# Altium footprint library ICs.PcbLib: 163 footprints (part 2 of 11)
Each footprint in its own frame and in the unit in brackets; x right, y up, seen from the top. Pads: shape width x height; smd on the part's side, far side on the other; paste and mask are expansions set on the pad; w line width, h text height; cw(c..) or ccw(c..) is an arc to the next point about the centre after c.
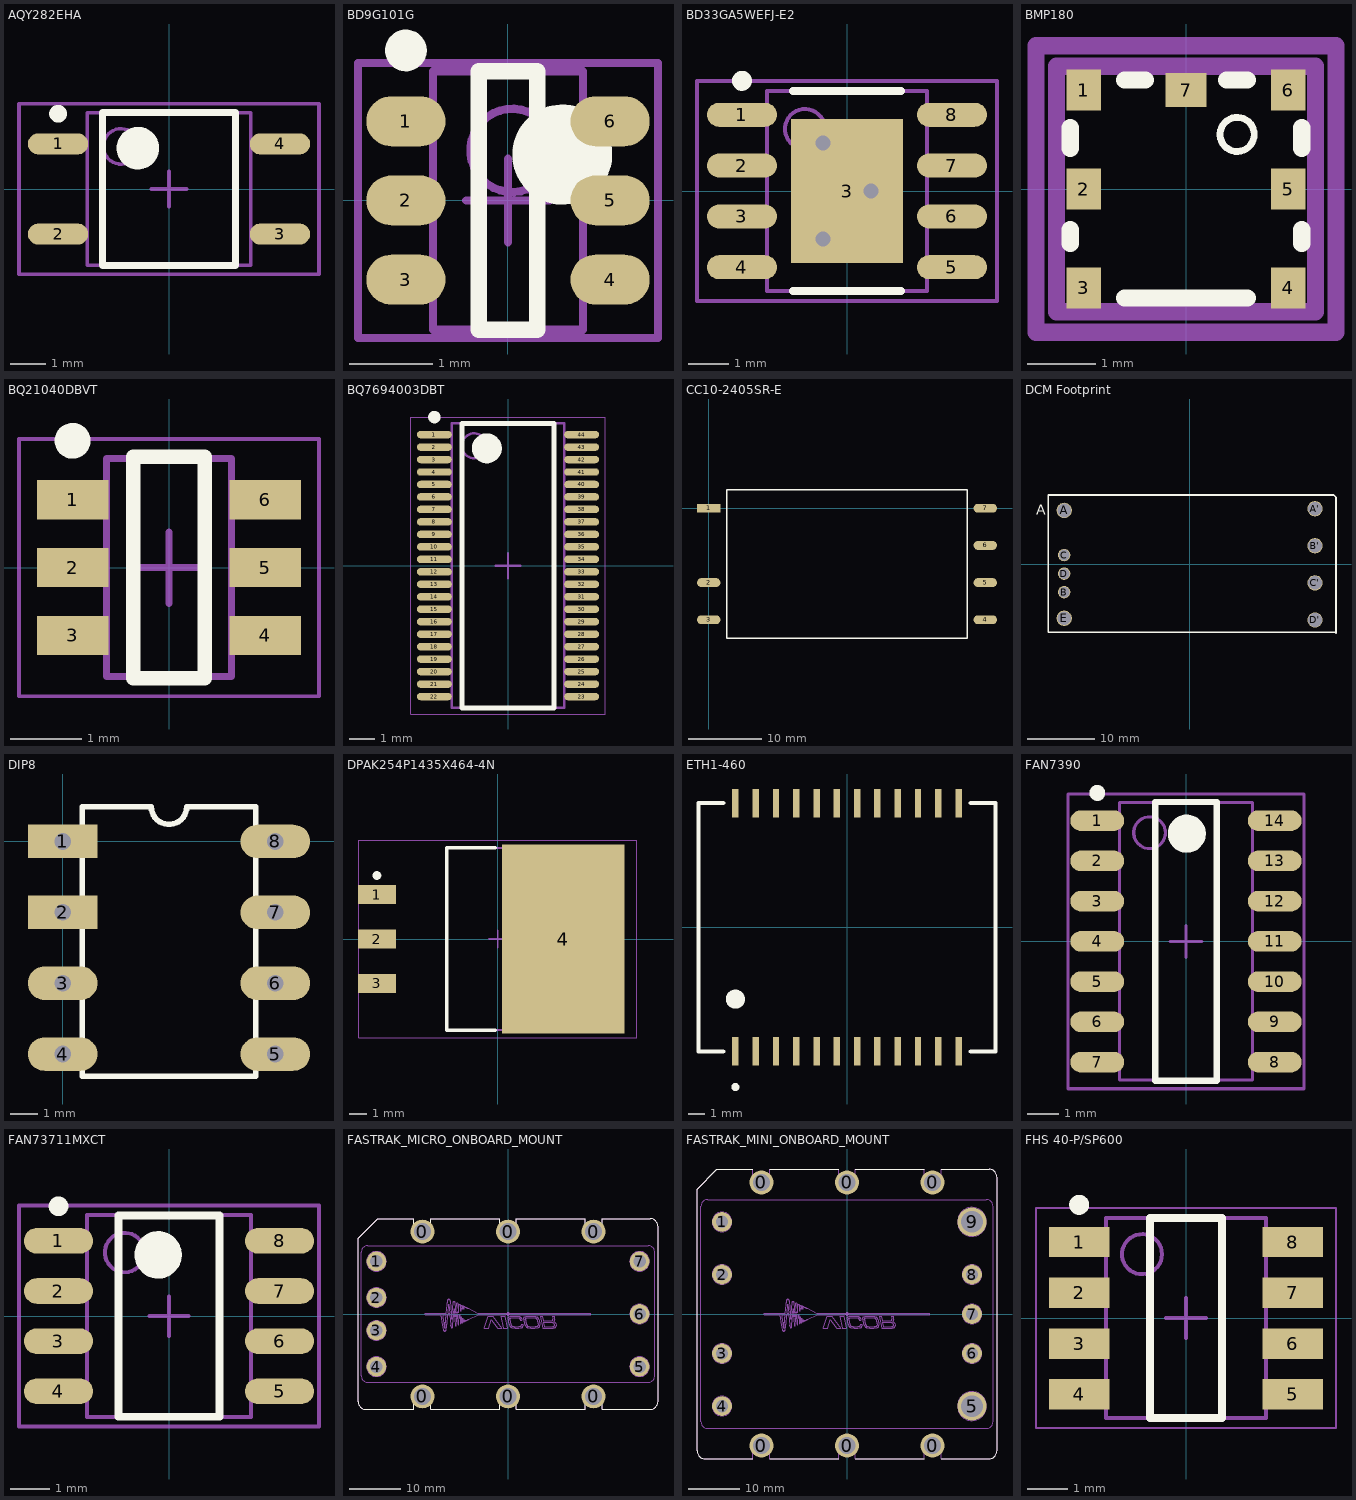
[diagram p1: the footprints below, top view; thin cyan lines are the x and y axes]

## AQY282EHA [mm] "SOP, 4-Leads, Body 4.3x4.6mm (max), Pitch 2.54mm, IPC Medium Density"
height 2.2
pads (4):
  oval 1.7x0.6 smd: 1(-3.125,1.27) 2(-3.125,-1.27) 3(3.125,-1.27) 4(3.125,1.27)
Top Overlay:
  circle w0.6: c-0.875,1.15 r0.3
  circle w0.25: c-3.125,2.12 r0.125
  lines w0.2: -1.875,-2.15 1.875,-2.15 1.875,2.15 -1.875,2.15 -1.875,-2.15
Mechanical 13:
  circle w0.1: c-1.35,1.2 r0.5
  lines w0.1: -2.3,-2.15 2.3,-2.15 2.3,2.15 -2.3,2.15 -2.3,-2.15
Mechanical 15:
  lines w0.1: -0.5,0 0.5,0 ; 0,-0.5 0,0.5 ; -4.225,-2.4 4.225,-2.4 4.225,2.4 -4.225,2.4 -4.225,-2.4
3D body: height 2.2, standoff 0.1, extent -2.3,-2.15 2.3,2.15

## BD9G101G [mm] "Simple Step-down Switching Regulators with Built-in Power MOSFET"
height 1.25
pads (6):
  oval 0.95x0.6 smd: 1(-1.225,0.95) 2(-1.225,0) 3(-1.225,-0.95) 4(1.225,-0.95) 5(1.225,0) 6(1.225,0.95)
Top Overlay:
  circle w0.6: c0.65,0.55 r0.3
  circle w0.25: c-1.225,1.8 r0.125
  lines w0.2: -0.35,-1.55 0.35,-1.55 0.35,1.55 -0.35,1.55 -0.35,-1.55
Mechanical 13:
  circle w0.1: c0.05,0.6 r0.5
  lines w0.1: -0.9,-1.55 0.9,-1.55 0.9,1.55 -0.9,1.55 -0.9,-1.55
Mechanical 15:
  lines w0.1: -0.5,0 0.5,0 ; 0,-0.5 0,0.5 ; -1.8,-1.65 1.8,-1.65 1.8,1.65 -1.8,1.65 -1.8,-1.65
3D body: height 1.25, standoff 0, extent -0.9,-1.55 0.9,1.55

## BD33GA5WEFJ-E2 [mm] "IC REG LDO 3.3V 0.5A 8HTSOP-J"
height 1
pads (9):
  oval 1.75x0.6 smd: 1(-2.625,1.905) 2(-2.625,0.635) 3(-2.625,-0.635) 4(-2.625,-1.905) 5(2.625,-1.905) 6(2.625,-0.635) 7(2.625,0.635) 8(2.625,1.905)
  rect 2.8x3.6 smd: 3(0,0)
via -0.6,1.2 diameter 0.737 hole 0.381
via 0.6,0 diameter 0.737 hole 0.381
via -0.6,-1.2 diameter 0.737 hole 0.381
Top Overlay:
  circle w0.25: c-2.625,2.755 r0.125
  lines w0.2: -1.35,-2.5 1.35,-2.5 ; -1.35,2.5 1.35,2.5
Mechanical 13:
  circle w0.1: c-1.05,1.55 r0.5
  lines w0.1: -2,-2.5 -2,2.5 2,2.5 2,-2.5 -2,-2.5
Mechanical 15:
  lines w0.1: -0.5,0 0.5,0 ; 0,-0.5 0,0.5 ; -3.75,-2.75 -3.75,2.75 3.75,2.75 3.75,-2.75 -3.75,-2.75
3D body: height 1, standoff 0.08, extent -2,-2.5 2,2.5

## BMP180 [mm]
pads (7):
  rect 0.5x0.6 smd: 1(-1.5,1.45) 2(-1.5,0) 3(-1.5,-1.45) 4(1.5,-1.45) 5(1.5,0) 6(1.5,1.45)
  rect 0.6x0.5 smd: 7(0,1.45)
Top Overlay:
  circle w0.1: c0.75,0.8 r0.25
  lines w0.254: -1.7,-0.8 -1.7,-0.6 ; -1.7,0.6 -1.7,0.9 ; -0.9,-1.6 0.9,-1.6 ; -0.9,1.6 -0.6,1.6 ; 0.6,1.6 0.9,1.6 ; 1.7,-0.8 1.7,-0.6 ; 1.7,0.6 1.7,0.9
Mechanical 13:
  lines w0.254: -1.9,-1.8 -1.9,1.8 1.9,1.8 1.9,-1.8 -1.9,-1.8
Mechanical 15:
  lines w0.254: -2.2,-2.1 -2.2,2.1 2.2,2.1 2.2,-2.1 -2.2,-2.1
3D body: height 2, standoff 0, extent -1.9,-1.8 1.9,1.8

## BQ21040DBVT [mm] "IC BAT CHG LI-ION 1 CELL SOT23-6"
height 1.45
pads (6):
  rect 1x0.55 smd: 1(-1.35,0.95) 2(-1.35,0) 3(-1.35,-0.95) 4(1.35,-0.95) 5(1.35,0) 6(1.35,0.95)
Top Overlay:
  circle w0.25: c-1.35,1.775 r0.125
  lines w0.2: -0.5,-1.55 0.5,-1.55 0.5,1.55 -0.5,1.55 -0.5,-1.55
Mechanical 13:
  lines w0.1: -0.875,-1.525 -0.875,1.525 0.875,1.525 0.875,-1.525 -0.875,-1.525
Mechanical 15:
  lines w0.05: -2.1,-1.8 -2.1,1.8 2.1,1.8 2.1,-1.8 -2.1,-1.8
  lines w0.1: -0.5,0 0.5,0 ; 0,-0.5 0,0.5
3D body: height 1.45, standoff 0, extent -0.875,-1.525 0.875,1.525

## BQ7694003DBT [mm] "TSSOP, 44-Leads, Body 11.15x4.40mm, Pitch 0.50mm, IPC Medium Density"
height 1.2
pads (44):
  oval 1.4x0.3 smd: 1(-2.95,5.25) 2(-2.95,4.75) 3(-2.95,4.25) 4(-2.95,3.75) 5(-2.95,3.25) 6(-2.95,2.75) 7(-2.95,2.25) 8(-2.95,1.75) 9(-2.95,1.25) 10(-2.95,0.75) 11(-2.95,0.25) 12(-2.95,-0.25) 13(-2.95,-0.75) 14(-2.95,-1.25) 15(-2.95,-1.75) 16(-2.95,-2.25) 17(-2.95,-2.75) 18(-2.95,-3.25) 19(-2.95,-3.75) 20(-2.95,-4.25) 21(-2.95,-4.75) 22(-2.95,-5.25) 23(2.95,-5.25) 24(2.95,-4.75) 25(2.95,-4.25) 26(2.95,-3.75) 27(2.95,-3.25) 28(2.95,-2.75) 29(2.95,-2.25) 30(2.95,-1.75) 31(2.95,-1.25) 32(2.95,-0.75) 33(2.95,-0.25) 34(2.95,0.25) 35(2.95,0.75) 36(2.95,1.25) 37(2.95,1.75) 38(2.95,2.25) 39(2.95,2.75) 40(2.95,3.25) 41(2.95,3.75) 42(2.95,4.25) 43(2.95,4.75) 44(2.95,5.25)
Top Overlay:
  circle w0.6: c-0.85,4.7 r0.3
  circle w0.25: c-2.95,5.95 r0.125
  lines w0.2: -1.85,-5.7 1.85,-5.7 1.85,5.7 -1.85,5.7 -1.85,-5.7
Mechanical 13:
  circle w0.1: c-1.35,4.8 r0.5
  lines w0.1: -2.25,-5.7 2.25,-5.7 2.25,5.7 -2.25,5.7 -2.25,-5.7
Mechanical 15:
  lines w0.05: -3.9,-5.95 3.9,-5.95 3.9,5.95 -3.9,5.95 -3.9,-5.95
  lines w0.1: -0.5,0 0.5,0 ; 0,-0.5 0,0.5
3D body: height 1.2, standoff 0.05, extent -2.25,-5.7 2.25,5.7

## CC10-2405SR-E [mm] "CONV DC/DC 10W SNGL 24V 5V SMD"
pads (7):
  rect 3.2x1.2 smd: 1(0,0)
  oval 3.2x1.2 smd: 2(0,-10.16) 3(0,-15.24) 4(37.8,-15.24) 5(37.8,-10.16) 6(37.8,-5.08) 7(37.8,0)
Top Overlay:
  lines w0.2: 2.435,-17.78 35.365,-17.78 35.365,2.54 2.435,2.54 2.435,-17.78
3D body "cc10r.stp": height 6.9, standoff -1.6, extent -0.583,-18.869 38.277,3.731

## DCM Footprint [mm] "For DC-DC Converter Module"
pads (9):
  round 2.28 hole 2.03: A(-18.6,8) A'(18.6,8.25) B'(18.6,2.75) C'(18.6,-2.75) D'(18.6,-8.25) E(-18.6,-8)
  round 1.85 hole 1.6: B(-18.6,-4.13) C(-18.6,1.38) D(-18.6,-1.38)
Top Overlay:
  lines w0.254: -20.955,10.262 -20.955,-10.058 21.59,-10.058 21.717,-10.185 21.717,9.957 21.387,10.287 -20.955,10.287
  text "A" at -22.784,7.341 h1.52
3D body "3623_dcm_thruhole.STEP": height 7.49, standoff -3.94, extent -19.358,-11.446 19.358,11.354

## DIP8 [mm]
pads (8):
  rect 2.5x1.2 hole 0.6: 1(0,0) 2(0,-2.54)
  oval 2.5x1.2 hole 0.6: 3(0,-5.08) 4(0,-7.62) 5(7.62,-7.62) 6(7.62,-5.08) 7(7.62,-2.54) 8(7.62,0)
Top Overlay:
  lines w0.2: 0.695,-8.407 0.695,1.245 3.175,1.245 ccw(c3.81,1.245) 4.445,1.245 6.925,1.245 6.925,-8.407 0.695,-8.407
3D body "INA111.stp": height 4.51, standoff -3.07, extent -0.305,-8.458 7.899,0.813

## DPAK254P1435X464-4N [mm] "D2-PAK, 4-Pads, Body 7.55x8.56mm (max), IPC Medium Density"
height 4.64
pads (4):
  rect 2.16x1.07 smd: 1(-6.9,2.54) 2(-6.9,0) 3(-6.9,-2.54)
  rect 6.99x10.8 smd: 4(3.75,0)
Top Overlay:
  circle w0.25: c-6.9,3.625 r0.125
  lines w0.2: -0.145,-5.2 -2.9,-5.2 -2.9,5.2 -0.145,5.2
Mechanical 13:
  lines w0.1: -2.9,-5.2 -2.9,5.2 5.99,5.2 5.99,-5.2 -2.9,-5.2
Mechanical 15:
  lines w0.05: -7.925,-5.65 -7.925,5.65 7.925,5.65 7.925,-5.65 -7.925,-5.65
  lines w0.1: -0.5,0 0.5,0 ; 0,-0.5 0,0.5
3D body: height 4.64, standoff 0, extent -2.9,-5.2 5.99,5.2

## ETH1-460 [mm] "\"PoE Plus\" Transformers Audio & Signal ETH1 60W 4pairs PoE+ Magnetic Module"
height 10.16
pads (24):
  rect 0.4x1.78 smd: 1(-6.985,-7.765) 2(-5.715,-7.765) 3(-4.445,-7.765) 4(-3.175,-7.765) 5(-1.905,-7.765) 6(-0.635,-7.765) 7(0.635,-7.765) 8(1.905,-7.765) 9(3.175,-7.765) 10(4.445,-7.765) 11(5.715,-7.765) 12(6.985,-7.765) 13(6.985,7.765) 14(5.715,7.765) 15(4.445,7.765) 16(3.175,7.765) 17(1.905,7.765) 18(0.635,7.765) 19(-0.635,7.765) 20(-1.905,7.765) 21(-3.175,7.765) 22(-4.445,7.765) 23(-5.715,7.765) 24(-6.985,7.765)
Top Overlay:
  circle w0.6: c-6.985,-4.5 r0.3
  circle w0.25: c-6.985,-10 r0.125
  lines w0.254: -7.745,-7.765 -9.3,-7.765 -9.3,7.765 -7.745,7.765 ; 7.745,-7.765 9.3,-7.765 9.3,7.765 7.745,7.765
3D body "Coilcraft-ETH1-460L.STEP": height 10.16, standoff 0, extent -9.3,-8.25 9.3,8.25

## FAN7390 [mm] "High-Current, High & Low-Side, Gate-Drive IC"
height 1.65
pads (14):
  oval 1.7x0.65 smd: 1(-2.8,3.81) 2(-2.8,2.54) 3(-2.8,1.27) 4(-2.8,0) 5(-2.8,-1.27) 6(-2.8,-2.54) 7(-2.8,-3.81) 8(2.8,-3.81) 9(2.8,-2.54) 10(2.8,-1.27) 11(2.8,0) 12(2.8,1.27) 13(2.8,2.54) 14(2.8,3.81)
Top Overlay:
  circle w0.25: c-2.8,4.685 r0.125
  circle w0.6: c0.025,3.4 r0.3
  lines w0.2: -0.975,-4.4 -0.975,4.4 0.975,4.4 0.975,-4.4 -0.975,-4.4
Mechanical 13:
  circle w0.1: c-1.15,3.43 r0.5
  lines w0.1: -2.1,-4.38 -2.1,4.38 2.1,4.38 2.1,-4.38 -2.1,-4.38
Mechanical 15:
  lines w0.1: -0.5,0 0.5,0 ; 0,-0.5 0,0.5 ; -3.725,-4.65 -3.725,4.65 3.725,4.65 3.725,-4.65 -3.725,-4.65
3D body: height 1.65, standoff 0.05, extent -2.1,-4.38 2.1,4.38

## FAN73711MXCT [mm] "High side FET driver"
height 1.8
pads (8):
  oval 1.75x0.65 smd: 1(-2.8,1.905) 2(-2.8,0.635) 3(-2.8,-0.635) 4(-2.8,-1.905) 5(2.8,-1.905) 6(2.8,-0.635) 7(2.8,0.635) 8(2.8,1.905)
Top Overlay:
  circle w0.25: c-2.8,2.78 r0.125
  circle w0.6: c-0.275,1.55 r0.3
  lines w0.2: -1.275,-2.55 -1.275,2.55 1.275,2.55 1.275,-2.55 -1.275,-2.55
Mechanical 13:
  circle w0.1: c-1.125,1.61 r0.5
  lines w0.1: -2.075,-2.56 -2.075,2.56 2.075,2.56 2.075,-2.56 -2.075,-2.56
Mechanical 15:
  lines w0.1: -0.5,0 0.5,0 ; 0,-0.5 0,0.5 ; -3.8,-2.8 -3.8,2.8 3.8,2.8 3.8,-2.8 -3.8,-2.8
3D body: height 1.8, standoff 0.1, extent -2.075,-2.56 2.075,2.56

## FASTRAK_MICRO_ONBOARD_MOUNT [mil]
pads (13):
  round 182 hole 128.5: 0(-650,-626) 0(-650,626) 0(0,-626) 0(0,626) 0(650,-626) 0(650,626)
  round 150 hole 94: 1(-1000,400) 2(-1000,125) 3(-1000,-125) 4(-1000,-400) 5(1000,-400) 6(1000,0) 7(1000,400)
Top Overlay:
  lines w8: -1140,-665 ccw(c-1080,-665) -1080,-725 -714.5,-725 -714.5,-635 cw(c-650,-635) -585.5,-635 -585.5,-725 -64.5,-725 -64.5,-635 cw(c0,-635) 64.5,-635 64.5,-725 585.5,-725 585.5,-635 cw(c650,-635) 714.5,-635 714.5,-725 1080,-725 ccw(c1080,-665) 1140,-665 1140,665 ccw(c1080,665) 1080,725 714.5,725 714.5,635 cw(c650,635) 585.5,635 585.5,725 64.5,725 64.5,635 cw(c0,635) -64.5,635 -64.5,725 -585.5,725 -585.5,635 cw(c-650,635) -714.5,635 -714.5,725 -990,725 -1140,575 -1140,-665
Mechanical 1:
  drawing of 1232 lines, arcs and shapes, not listed
Mechanical 2:
  circle w3: c1000,400 r40
  circle w3: c1000,0 r40
  circle w3: c1000,-400 r40
  circle w3: c1000,400 r75
  circle w3: c1000,0 r75
  circle w3: c1000,-400 r75
  circle w3: c1000,400 r47
  circle w3: c1000,0 r47
  circle w3: c1000,-400 r47
  circle w3: c-1000,400 r40
  circle w3: c-1000,125 r40
  circle w3: c-1000,-400 r40
  circle w3: c-1000,-125 r40
  circle w3: c-1000,-400 r75
  circle w3: c-1000,-125 r75
  circle w3: c-1000,125 r75
  circle w3: c-1000,400 r75
  circle w3: c-1000,400 r47
  circle w3: c-1000,125 r47
  circle w3: c-1000,-125 r47
  circle w3: c-1000,-400 r47
Drill Drawing:
  circle w1: c-1000,-400 r47
  circle w1: c-1000,-125 r47
  circle w1: c-1000,125 r47
  circle w1: c-1000,400 r47
  circle w1: c1000,-400 r47
  circle w1: c1000,0 r47
  circle w1: c1000,400 r47
3D body "37207r1-VxxCxxxxxxB3P.STP": height 511.81, standoff -39.87, extent -1140,-725 1140,725

## FASTRAK_MINI_ONBOARD_MOUNT [mil]
pads (15):
  round 182 hole 128.5: 0(-650,-1000) 0(-650,1000) 0(0,-1000) 0(0,1000) 0(650,-1000) 0(650,1000)
  round 150 hole 94: 1(-950,700) 2(-950,300) 3(-950,-300) 4(-950,-700) 6(950,-300) 7(950,0) 8(950,300)
  round 220 hole 164: 5(950,-700) 9(950,700)
Top Overlay:
  lines w8: -714.5,-1100 -1080,-1100 cw(c-1080,-1040) -1140,-1040 -1140,950 -990,1100 -714.5,1100 ; -585.5,-1100 -64.5,-1100 ; -585.5,1100 -64.5,1100 ; 64.5,-1100 585.5,-1100 ; 64.5,1100 585.5,1100 ; 714.5,-1100 1080,-1100 ccw(c1080,-1040) 1140,-1040 1140,1040 ccw(c1080,1040) 1080,1100 714.5,1100
Mechanical 1:
  drawing of 1242 lines, arcs and shapes, not listed
Mechanical 2:
  circle w3: c950,300 r47
  circle w3: c950,0 r47
  circle w3: c950,-300 r47
  circle w3: c950,-300 r40
  circle w3: c950,0 r40
  circle w3: c950,300 r40
  circle w3: c950,300 r75
  circle w3: c950,0 r75
  circle w3: c950,-300 r75
  circle w3: c950,-700 r110
  circle w3: c950,700 r110
  circle w3: c950,-700 r82
  circle w3: c950,700 r82
  circle w3: c950,700 r75
  circle w3: c950,-700 r75
  circle w3: c-950,700 r75
  circle w3: c-950,300 r75
  circle w3: c-950,-300 r75
  circle w3: c-950,-700 r75
  circle w3: c-950,700 r47
  circle w3: c-950,300 r47
  circle w3: c-950,-300 r47
  circle w3: c-950,-700 r47
  circle w3: c-950,-700 r40
  circle w3: c-950,-300 r40
  circle w3: c-950,300 r40
  circle w3: c-950,700 r40
Drill Drawing:
  circle w3: c-950,-700 r47
  circle w3: c-950,-300 r47
  circle w3: c-950,300 r47
  circle w3: c-950,700 r47
  circle w3: c950,700 r82
  circle w3: c950,-700 r82
  circle w3: c950,-300 r47
  circle w3: c950,0 r47
  circle w3: c950,300 r47
3D body "37206r1-VxxBxxxxxxBLP.STP": height 512.4, standoff -120.5, extent -1141.39,-1103.29 1145.45,1103.31

## FHS 40-P/SP600 [mm] "SENSOR CURRENT 100A 5V BI 8SOIC"
height 1.72
pads (8):
  rect 1.52x0.76 smd: 1(-2.67,1.905) 2(-2.67,0.635) 3(-2.67,-0.635) 4(-2.67,-1.905) 5(2.67,-1.905) 6(2.67,-0.635) 7(2.67,0.635) 8(2.67,1.905)
Top Overlay:
  circle w0.25: c-2.67,2.835 r0.125
  lines w0.2: -0.9,-2.5 0.9,-2.5 0.9,2.5 -0.9,2.5 -0.9,-2.5
Mechanical 13:
  circle w0.1: c-1.1,1.6 r0.5
  lines w0.1: -2,-2.5 2,-2.5 2,2.5 -2,2.5 -2,-2.5
Mechanical 15:
  lines w0.05: -3.75,-2.75 3.75,-2.75 3.75,2.75 -3.75,2.75 -3.75,-2.75
  lines w0.1: -0.5,0 0.5,0 ; 0,-0.5 0,0.5
3D body: height 1.72, standoff 0, extent -2,-2.5 2,2.5